# Altium footprint library 3M THD.PcbLib: 163 footprints (part 5 of 14) (continued)
## 3M_N2540-6003RB [mm] "40 Contacts - Straight .100\" x .100\" Low Profile Four-Wall Header"
height 9.91
pads (40):
  round 1.6 hole 1: 1(-24.13,-1.27) 2(-24.13,1.27) 3(-21.59,-1.27) 4(-21.59,1.27) 5(-19.05,-1.27) 6(-19.05,1.27) 7(-16.51,-1.27) 8(-16.51,1.27) 9(-13.97,-1.27) 10(-13.97,1.27) 11(-11.43,-1.27) 12(-11.43,1.27) 13(-8.89,-1.27) 14(-8.89,1.27) 15(-6.35,-1.27) 16(-6.35,1.27) 17(-3.81,-1.27) 18(-3.81,1.27) 19(-1.27,-1.27) 20(-1.27,1.27) 21(1.27,-1.27) 22(1.27,1.27) 23(3.81,-1.27) 24(3.81,1.27) 25(6.35,-1.27) 26(6.35,1.27) 27(8.89,-1.27) 28(8.89,1.27) 29(11.43,-1.27) 30(11.43,1.27) 31(13.97,-1.27) 32(13.97,1.27) 33(16.51,-1.27) 34(16.51,1.27) 35(19.05,-1.27) 36(19.05,1.27) 37(21.59,-1.27) 38(21.59,1.27) 39(24.13,-1.27) 40(24.13,1.27)
Top Overlay:
  circle w0.3: c-24.13,-4.699 r0.15
  lines w0.2: -28.042,-1.603 -25.629,-1.603 -25.629,1.603 -28.042,1.603 ; -28.042,-1.524 -28.346,-1.524 -28.346,1.524 -28.042,1.524 ; -24.994,-4.064 -24.13,-3.2 -23.266,-4.064 ; -23.178,3.15 -28.042,3.15 -28.042,-3.2 -3.366,-3.2 ; -23.178,4.064 -23.178,2.159 -22.469,2.159 ; -21.361,-3.835 -21.361,-3.2 ; -19.279,-3.835 -19.279,-3.2 ; -18.987,2.518 -18.987,4.064 ; -18.987,3.15 18.987,3.15 ; -3.366,-4.064 -3.366,-2.438 ; 0.826,-4.064 0.826,-2.438 ; 0.826,-3.2 28.042,-3.2 28.042,3.15 25.4,3.15 ; 18.987,2.518 18.987,4.064 ; 21.819,-3.835 21.819,-3.2 ; 22.469,2.159 23.178,2.159 23.178,4.064 ; 23.901,-3.835 23.901,-3.2 ; 28.042,-1.603 25.629,-1.603 25.629,1.603 28.042,1.603 ; 28.042,-1.524 28.346,-1.524 28.346,1.524 28.042,1.524 ; -29.058,-4.064 -22.352,-4.064 -22.352,-3.835 -18.288,-3.835 -18.288,-4.064 20.828,-4.064 20.828,-3.835 24.892,-3.835 24.892,-4.064 29.058,-4.064 29.058,4.064 28.397,4.064 ccw(c27.94,4.064) 27.483,4.064 -0.813,4.064 ccw(c-1.27,4.064) -1.727,4.064 -27.483,4.064 ccw(c-27.94,4.064) -28.397,4.064 -29.058,4.064 -29.058,-4.064
  text "40" at 23.495,2.667 h1.02
Mechanical 14:
  lines w0.1: -28.042,-1.603 -25.629,-1.603 -25.629,1.603 -28.042,1.603 ; -28.042,-1.524 -28.346,-1.524 -28.346,1.524 -28.042,1.524 ; -24.994,-4.064 -24.13,-3.2 -23.266,-4.064 ; -23.178,3.15 -28.042,3.15 -28.042,-3.2 -3.366,-3.2 ; -23.178,4.064 -23.178,2.159 -18.987,2.159 -18.987,4.064 ; -21.361,-3.835 -21.361,-3.2 ; -19.279,-3.835 -19.279,-3.2 ; -18.987,3.15 18.987,3.15 ; -3.366,-4.064 -3.366,-2.159 0.826,-2.159 0.826,-4.064 ; 0.826,-3.2 28.042,-3.2 28.042,3.15 25.4,3.15 ; 18.987,4.064 18.987,2.159 23.178,2.159 23.178,4.064 ; 21.819,-3.835 21.819,-3.2 ; 23.901,-3.835 23.901,-3.2 ; 28.042,-1.603 25.629,-1.603 25.629,1.603 28.042,1.603 ; 28.042,-1.524 28.346,-1.524 28.346,1.524 28.042,1.524 ; -29.058,-4.064 -22.352,-4.064 -22.352,-3.835 -18.288,-3.835 -18.288,-4.064 20.828,-4.064 20.828,-3.835 24.892,-3.835 24.892,-4.064 29.058,-4.064 29.058,4.064 28.397,4.064 ccw(c27.94,4.064) 27.483,4.064 -0.813,4.064 ccw(c-1.27,4.064) -1.727,4.064 -27.483,4.064 ccw(c-27.94,4.064) -28.397,4.064 -29.058,4.064 -29.058,-4.064
  text "40" at 23.495,2.667 h1.02
3D body "3M_N2540-6003RB.stp": height 9.91, standoff -3.94, extent -29.057,-4.115 29.058,4.521

## 3M_N2550-5002RB [mm] "50 Contacts - Right Angle .100\" x .100\" Low Profile Four-Wall Header"
height 8.59
pads (50):
  round 1.6 hole 0.9: 1(-30.48,-1.27) 2(-30.48,1.27) 3(-27.94,-1.27) 4(-27.94,1.27) 5(-25.4,-1.27) 6(-25.4,1.27) 7(-22.86,-1.27) 8(-22.86,1.27) 9(-20.32,-1.27) 10(-20.32,1.27) 11(-17.78,-1.27) 12(-17.78,1.27) 13(-15.24,-1.27) 14(-15.24,1.27) 15(-12.7,-1.27) 16(-12.7,1.27) 17(-10.16,-1.27) 18(-10.16,1.27) 19(-7.62,-1.27) 20(-7.62,1.27) 21(-5.08,-1.27) 22(-5.08,1.27) 23(-2.54,-1.27) 24(-2.54,1.27) 25(0,-1.27) 26(0,1.27) 27(2.54,-1.27) 28(2.54,1.27) 29(5.08,-1.27) 30(5.08,1.27) 31(7.62,-1.27) 32(7.62,1.27) 33(10.16,-1.27) 34(10.16,1.27) 35(12.7,-1.27) 36(12.7,1.27) 37(15.24,-1.27) 38(15.24,1.27) 39(17.78,-1.27) 40(17.78,1.27) 41(20.32,-1.27) 42(20.32,1.27) 43(22.86,-1.27) 44(22.86,1.27) 45(25.4,-1.27) 46(25.4,1.27) 47(27.94,-1.27) 48(27.94,1.27) 49(30.48,-1.27) 50(30.48,1.27)
Top Overlay:
  circle w0.3: c-32.25,-1.27 r0.15
  lines w0.2: -28.702,2.459 -28.702,11.273 ; -28.702,4.009 -27.432,4.009 -27.432,6.295 ; -27.711,11.273 -27.711,10.054 -25.629,10.054 -25.629,11.273 ; -27.432,4.85 -25.908,4.847 ; -27.432,6.297 cw(c-26.67,6.297) -25.908,6.297 ; -25.908,6.295 -25.908,4.009 -24.638,4.007 ; -24.638,2.459 -24.638,11.273 ; -3.366,11.273 cw(c-3.366,10.003) -2.096,10.003 -2.095,4.339 ccw(c-1.46,4.339) -1.46,3.704 1.46,3.704 ccw(c1.46,4.339) 2.095,4.339 2.095,10.003 cw(c3.366,10.003) 3.366,11.273 ; -2.095,4.847 2.095,4.847 ; -0.314,4.853 -0.314,10.719 ; 0.314,4.847 0.314,10.719 ; 27.178,2.459 27.178,11.273 ; 27.178,4.009 28.448,4.009 28.448,6.295 cw(c29.21,6.295) 29.972,6.295 29.972,4.009 31.242,4.009 ; 28.448,4.847 29.972,4.847 ; 31.242,2.459 31.242,11.273 ; -0.314,10.719 0.314,10.719 ; -0.314,10.719 -0.06,10.973 0.06,10.973 0.314,10.719 ; -35.408,1.875 -35.408,11.273 35.408,11.273 35.408,1.875 33.655,1.875 cw(c33.401,1.875) 33.147,1.875 33.147,2.459 -33.147,2.459 -33.147,1.875 cw(c-33.401,1.875) -33.655,1.875 -35.408,1.875
  text "50" at 31.965,0.206 h1.02
Mechanical 8:
  drawing of 204 lines, arcs and shapes, not listed
Mechanical 14:
  circle w0.3: c-32.25,-1.27 r0.15
  lines w0.1: -28.702,2.459 -28.702,11.273 ; -28.702,4.009 -27.432,4.009 -27.432,6.295 ; -27.711,11.273 -27.711,10.054 -25.629,10.054 -25.629,11.273 ; -27.432,4.85 -25.908,4.847 ; -27.432,6.297 cw(c-26.67,6.297) -25.908,6.297 ; -25.908,6.295 -25.908,4.009 -24.638,4.007 ; -24.638,2.459 -24.638,11.273 ; -3.366,11.273 cw(c-3.366,10.003) -2.096,10.003 -2.095,4.339 ccw(c-1.46,4.339) -1.46,3.704 1.46,3.704 ccw(c1.46,4.339) 2.095,4.339 2.095,10.003 cw(c3.366,10.003) 3.366,11.273 ; -2.095,4.847 2.095,4.847 ; -0.314,4.853 -0.314,10.719 ; 0.314,4.847 0.314,10.719 ; 27.178,2.459 27.178,11.273 ; 27.178,4.009 28.448,4.009 28.448,6.295 cw(c29.21,6.295) 29.972,6.295 29.972,4.009 31.242,4.009 ; 28.448,4.847 29.972,4.847 ; 31.242,2.459 31.242,11.273 ; -0.314,10.719 0.314,10.719 ; -0.314,10.719 -0.06,10.973 0.06,10.973 0.314,10.719 ; -35.408,1.875 -35.408,11.273 35.408,11.273 35.408,1.875 33.655,1.875 cw(c33.401,1.875) 33.147,1.875 33.147,2.459 -33.147,2.459 -33.147,1.875 cw(c-33.401,1.875) -33.655,1.875 -35.408,1.875
  text "50" at 31.965,0.206 h1.02
3D body "3M_N2550-5002RB.stp": height 8.69, standoff -3.98, extent -35.408,-1.575 35.408,11.273

## 3M_N2550-6002RB [mm] "50 Contacts - Straight .100\" x .100\" Low Profile Four-Wall Header"
height 9.91
pads (50):
  round 1.6 hole 1: 1(-30.48,-1.27) 2(-30.48,1.27) 3(-27.94,-1.27) 4(-27.94,1.27) 5(-25.4,-1.27) 6(-25.4,1.27) 7(-22.86,-1.27) 8(-22.86,1.27) 9(-20.32,-1.27) 10(-20.32,1.27) 11(-17.78,-1.27) 12(-17.78,1.27) 13(-15.24,-1.27) 14(-15.24,1.27) 15(-12.7,-1.27) 16(-12.7,1.27) 17(-10.16,-1.27) 18(-10.16,1.27) 19(-7.62,-1.27) 20(-7.62,1.27) 21(-5.08,-1.27) 22(-5.08,1.27) 23(-2.54,-1.27) 24(-2.54,1.27) 25(0,-1.27) 26(0,1.27) 27(2.54,-1.27) 28(2.54,1.27) 29(5.08,-1.27) 30(5.08,1.27) 31(7.62,-1.27) 32(7.62,1.27) 33(10.16,-1.27) 34(10.16,1.27) 35(12.7,-1.27) 36(12.7,1.27) 37(15.24,-1.27) 38(15.24,1.27) 39(17.78,-1.27) 40(17.78,1.27) 41(20.32,-1.27) 42(20.32,1.27) 43(22.86,-1.27) 44(22.86,1.27) 45(25.4,-1.27) 46(25.4,1.27) 47(27.94,-1.27) 48(27.94,1.27) 49(30.48,-1.27) 50(30.48,1.27)
Top Overlay:
  circle w0.3: c-30.48,-4.699 r0.15
  lines w0.2: -34.392,-1.603 -31.979,-1.603 -31.979,1.603 -34.392,1.603 ; -34.392,-1.524 -34.696,-1.524 -34.696,1.524 -34.392,1.524 ; -31.344,-4.064 -30.48,-3.2 -29.616,-4.064 ; -29.528,3.15 -34.392,3.15 -34.392,-3.2 -2.096,-3.2 ; -29.528,4.064 -29.528,2.159 -28.819,2.159 ; -27.711,-3.835 -27.711,-3.2 ; -25.629,-3.835 -25.629,-3.2 ; -25.337,2.518 -25.337,4.064 ; -25.337,3.15 25.337,3.15 ; -2.096,-4.064 -2.096,-2.438 ; 2.095,-4.064 2.095,-2.438 ; 2.095,-3.2 34.392,-3.2 34.392,3.15 31.75,3.15 ; 25.337,2.518 25.337,4.064 ; 28.169,-3.835 28.169,-3.2 ; 28.819,2.159 29.528,2.159 29.528,4.064 ; 30.251,-3.835 30.251,-3.2 ; 34.392,-1.603 31.979,-1.603 31.979,1.603 34.392,1.603 ; 34.392,-1.524 34.696,-1.524 34.696,1.524 34.392,1.524 ; -35.408,-4.064 -35.408,4.064 -34.747,4.064 cw(c-34.29,4.064) -33.833,4.064 -0.457,4.064 cw(c0,4.064) 0.457,4.064 33.833,4.064 cw(c34.29,4.064) 34.747,4.064 35.408,4.064 35.408,-4.064 31.242,-4.064 31.242,-3.835 27.178,-3.835 27.178,-4.064 -24.638,-4.064 -24.638,-3.835 -28.702,-3.835 -28.702,-4.064 -35.408,-4.064
  text "50" at 29.845,2.667 h1.02
Mechanical 14:
  lines w0.1: -34.392,-1.603 -31.979,-1.603 -31.979,1.603 -34.392,1.603 ; -34.392,-1.524 -34.696,-1.524 -34.696,1.524 -34.392,1.524 ; -31.344,-4.064 -30.48,-3.2 -29.616,-4.064 ; -29.528,3.15 -34.392,3.15 -34.392,-3.2 -2.096,-3.2 ; -29.528,4.064 -29.528,2.159 -25.337,2.159 -25.337,4.064 ; -27.711,-3.835 -27.711,-3.2 ; -25.629,-3.835 -25.629,-3.2 ; -25.337,3.15 25.337,3.15 ; -2.096,-4.064 -2.096,-2.159 2.095,-2.159 2.095,-4.064 ; 2.095,-3.2 34.392,-3.2 34.392,3.15 31.75,3.15 ; 25.337,4.064 25.337,2.159 29.528,2.159 29.528,4.064 ; 28.169,-3.835 28.169,-3.2 ; 30.251,-3.835 30.251,-3.2 ; 34.392,-1.603 31.979,-1.603 31.979,1.603 34.392,1.603 ; 34.392,-1.524 34.696,-1.524 34.696,1.524 34.392,1.524 ; -35.408,-4.064 -35.408,4.064 -34.747,4.064 cw(c-34.29,4.064) -33.833,4.064 -0.457,4.064 cw(c0,4.064) 0.457,4.064 33.833,4.064 cw(c34.29,4.064) 34.747,4.064 35.408,4.064 35.408,-4.064 31.242,-4.064 31.242,-3.835 27.178,-3.835 27.178,-4.064 -24.638,-4.064 -24.638,-3.835 -28.702,-3.835 -28.702,-4.064 -35.408,-4.064
  text "50" at 29.845,2.667 h1.02
3D body "3M_N2550-6002RB.stp": height 9.91, standoff -2.84, extent -35.408,-4.115 35.408,4.521

## 3M_N2550-6003RB [mm] "50 Contacts - Straight .100\" x .100\" Low Profile Four-Wall Header"
height 9.91
pads (50):
  round 1.6 hole 1: 1(-30.48,-1.27) 2(-30.48,1.27) 3(-27.94,-1.27) 4(-27.94,1.27) 5(-25.4,-1.27) 6(-25.4,1.27) 7(-22.86,-1.27) 8(-22.86,1.27) 9(-20.32,-1.27) 10(-20.32,1.27) 11(-17.78,-1.27) 12(-17.78,1.27) 13(-15.24,-1.27) 14(-15.24,1.27) 15(-12.7,-1.27) 16(-12.7,1.27) 17(-10.16,-1.27) 18(-10.16,1.27) 19(-7.62,-1.27) 20(-7.62,1.27) 21(-5.08,-1.27) 22(-5.08,1.27) 23(-2.54,-1.27) 24(-2.54,1.27) 25(0,-1.27) 26(0,1.27) 27(2.54,-1.27) 28(2.54,1.27) 29(5.08,-1.27) 30(5.08,1.27) 31(7.62,-1.27) 32(7.62,1.27) 33(10.16,-1.27) 34(10.16,1.27) 35(12.7,-1.27) 36(12.7,1.27) 37(15.24,-1.27) 38(15.24,1.27) 39(17.78,-1.27) 40(17.78,1.27) 41(20.32,-1.27) 42(20.32,1.27) 43(22.86,-1.27) 44(22.86,1.27) 45(25.4,-1.27) 46(25.4,1.27) 47(27.94,-1.27) 48(27.94,1.27) 49(30.48,-1.27) 50(30.48,1.27)
Top Overlay:
  circle w0.3: c-30.48,-4.699 r0.15
  lines w0.2: -34.392,-1.603 -31.979,-1.603 -31.979,1.603 -34.392,1.603 ; -34.392,-1.524 -34.696,-1.524 -34.696,1.524 -34.392,1.524 ; -31.344,-4.064 -30.48,-3.2 -29.616,-4.064 ; -29.528,3.15 -34.392,3.15 -34.392,-3.2 -2.096,-3.2 ; -29.528,4.064 -29.528,2.159 -28.819,2.159 ; -27.711,-3.835 -27.711,-3.2 ; -25.629,-3.835 -25.629,-3.2 ; -25.337,2.518 -25.337,4.064 ; -25.337,3.15 25.337,3.15 ; -2.096,-4.064 -2.096,-2.438 ; 2.095,-4.064 2.095,-2.438 ; 2.095,-3.2 34.392,-3.2 34.392,3.15 31.75,3.15 ; 25.337,2.518 25.337,4.064 ; 28.169,-3.835 28.169,-3.2 ; 28.819,2.159 29.528,2.159 29.528,4.064 ; 30.251,-3.835 30.251,-3.2 ; 34.392,-1.603 31.979,-1.603 31.979,1.603 34.392,1.603 ; 34.392,-1.524 34.696,-1.524 34.696,1.524 34.392,1.524 ; -35.408,-4.064 -28.702,-4.064 -28.702,-3.835 -24.638,-3.835 -24.638,-4.064 27.178,-4.064 27.178,-3.835 31.242,-3.835 31.242,-4.064 35.408,-4.064 35.408,4.064 34.747,4.064 ccw(c34.29,4.064) 33.833,4.064 0.457,4.064 ccw(c0,4.064) -0.457,4.064 -33.833,4.064 ccw(c-34.29,4.064) -34.747,4.064 -35.408,4.064 -35.408,-4.064
  text "50" at 29.845,2.667 h1.02
Mechanical 14:
  lines w0.1: -34.392,-1.603 -31.979,-1.603 -31.979,1.603 -34.392,1.603 ; -34.392,-1.524 -34.696,-1.524 -34.696,1.524 -34.392,1.524 ; -31.344,-4.064 -30.48,-3.2 -29.616,-4.064 ; -29.528,3.15 -34.392,3.15 -34.392,-3.2 -2.096,-3.2 ; -29.528,4.064 -29.528,2.159 -25.337,2.159 -25.337,4.064 ; -27.711,-3.835 -27.711,-3.2 ; -25.629,-3.835 -25.629,-3.2 ; -25.337,3.15 25.337,3.15 ; -2.096,-4.064 -2.096,-2.159 2.095,-2.159 2.095,-4.064 ; 2.095,-3.2 34.392,-3.2 34.392,3.15 31.75,3.15 ; 25.337,4.064 25.337,2.159 29.528,2.159 29.528,4.064 ; 28.169,-3.835 28.169,-3.2 ; 30.251,-3.835 30.251,-3.2 ; 34.392,-1.603 31.979,-1.603 31.979,1.603 34.392,1.603 ; 34.392,-1.524 34.696,-1.524 34.696,1.524 34.392,1.524 ; -35.408,-4.064 -28.702,-4.064 -28.702,-3.835 -24.638,-3.835 -24.638,-4.064 27.178,-4.064 27.178,-3.835 31.242,-3.835 31.242,-4.064 35.408,-4.064 35.408,4.064 34.747,4.064 ccw(c34.29,4.064) 33.833,4.064 0.457,4.064 ccw(c0,4.064) -0.457,4.064 -33.833,4.064 ccw(c-34.29,4.064) -34.747,4.064 -35.408,4.064 -35.408,-4.064
  text "50" at 29.845,2.667 h1.02
3D body "3M_N2550-6003RB.stp": height 9.91, standoff -3.94, extent -35.407,-4.115 35.408,4.521

## 3M_N2560-6002RB [mm] "60 Contacts - Straight .100\" x .100\" Low Profile Four-Wall Header"
height 9
pads (60):
  round 1.6 hole 1: 1(-36.83,-1.27) 2(-36.83,1.27) 3(-34.29,-1.27) 4(-34.29,1.27) 5(-31.75,-1.27) 6(-31.75,1.27) 7(-29.21,-1.27) 8(-29.21,1.27) 9(-26.67,-1.27) 10(-26.67,1.27) 11(-24.13,-1.27) 12(-24.13,1.27) 13(-21.59,-1.27) 14(-21.59,1.27) 15(-19.05,-1.27) 16(-19.05,1.27) 17(-16.51,-1.27) 18(-16.51,1.27) 19(-13.97,-1.27) 20(-13.97,1.27) 21(-11.43,-1.27) 22(-11.43,1.27) 23(-8.89,-1.27) 24(-8.89,1.27) 25(-6.35,-1.27) 26(-6.35,1.27) 27(-3.81,-1.27) 28(-3.81,1.27) 29(-1.27,-1.27) 30(-1.27,1.27) 31(1.27,-1.27) 32(1.27,1.27) 33(3.81,-1.27) 34(3.81,1.27) 35(6.35,-1.27) 36(6.35,1.27) 37(8.89,-1.27) 38(8.89,1.27) 39(11.43,-1.27) 40(11.43,1.27) 41(13.97,-1.27) 42(13.97,1.27) 43(16.51,-1.27) 44(16.51,1.27) 45(19.05,-1.27) 46(19.05,1.27) 47(21.59,-1.27) 48(21.59,1.27) 49(24.13,-1.27) 50(24.13,1.27) 51(26.67,-1.27) 52(26.67,1.27) 53(29.21,-1.27) 54(29.21,1.27) 55(31.75,-1.27) 56(31.75,1.27) 57(34.29,-1.27) 58(34.29,1.27) 59(36.83,-1.27) 60(36.83,1.27)
Top Overlay:
  circle w0.3: c-36.83,-4.699 r0.15
  lines w0.2: -40.742,-1.603 -38.329,-1.603 -38.329,1.603 -40.742,1.603 ; -40.742,-1.524 -41.046,-1.524 -41.046,1.524 -40.742,1.524 ; -37.694,-4.064 -36.83,-3.2 -35.966,-4.064 ; -35.878,3.15 -40.742,3.15 -40.742,-3.2 -3.366,-3.2 ; -35.878,4.064 -35.878,2.159 -35.169,2.159 ; -34.061,-3.835 -34.061,-3.2 ; -31.979,-3.835 -31.979,-3.2 ; -31.687,2.518 -31.687,4.064 ; -31.687,3.15 31.687,3.15 ; -3.366,-4.064 -3.366,-2.438 ; 0.826,-4.064 0.826,-2.438 ; 0.826,-3.2 40.742,-3.2 40.742,3.15 38.1,3.15 ; 31.687,2.518 31.687,4.064 ; 34.519,-3.835 34.519,-3.2 ; 35.169,2.159 35.878,2.159 35.878,4.064 ; 36.601,-3.835 36.601,-3.2 ; 40.742,-1.603 38.329,-1.603 38.329,1.603 40.742,1.603 ; 40.742,-1.524 41.046,-1.524 41.046,1.524 40.742,1.524 ; -41.758,-4.064 -35.052,-4.064 -35.052,-3.835 -30.988,-3.835 -30.988,-4.064 33.528,-4.064 33.528,-3.835 37.592,-3.835 37.592,-4.064 41.758,-4.064 41.758,4.064 41.097,4.064 ccw(c40.64,4.064) 40.183,4.064 -0.813,4.064 ccw(c-1.27,4.064) -1.727,4.064 -40.183,4.064 ccw(c-40.64,4.064) -41.097,4.064 -41.758,4.064 -41.758,-4.064
  text "60" at 36.195,2.667 h1.02
Mechanical 14:
  lines w0.1: -40.742,-1.603 -38.329,-1.603 -38.329,1.603 -40.742,1.603 ; -40.742,-1.524 -41.046,-1.524 -41.046,1.524 -40.742,1.524 ; -37.694,-4.064 -36.83,-3.2 -35.966,-4.064 ; -35.878,3.15 -40.742,3.15 -40.742,-3.2 -3.366,-3.2 ; -35.878,4.064 -35.878,2.159 -31.687,2.159 -31.687,4.064 ; -34.061,-3.835 -34.061,-3.2 ; -31.979,-3.835 -31.979,-3.2 ; -31.687,3.15 31.687,3.15 ; -3.366,-4.064 -3.366,-2.159 0.826,-2.159 0.826,-4.064 ; 0.826,-3.2 40.742,-3.2 40.742,3.15 38.1,3.15 ; 31.687,4.064 31.687,2.159 35.878,2.159 35.878,4.064 ; 34.519,-3.835 34.519,-3.2 ; 36.601,-3.835 36.601,-3.2 ; 40.742,-1.603 38.329,-1.603 38.329,1.603 40.742,1.603 ; 40.742,-1.524 41.046,-1.524 41.046,1.524 40.742,1.524 ; -41.758,-4.064 -35.052,-4.064 -35.052,-3.835 -30.988,-3.835 -30.988,-4.064 33.528,-4.064 33.528,-3.835 37.592,-3.835 37.592,-4.064 41.758,-4.064 41.758,4.064 41.097,4.064 ccw(c40.64,4.064) 40.183,4.064 -0.813,4.064 ccw(c-1.27,4.064) -1.727,4.064 -40.183,4.064 ccw(c-40.64,4.064) -41.097,4.064 -41.758,4.064 -41.758,-4.064
  text "60" at 36.195,2.667 h1.02
3D body "3M_N2560-6002RB.stp": height 9.65, standoff -2.84, extent -41.757,-4.166 41.758,4.521

## 3M_N2560-6003RB [mm] "60 Contacts - Straight .100\" x .100\" Low Profile Four-Wall Header"
height 9.91
pads (60):
  round 1.6 hole 1: 1(-36.83,-1.27) 2(-36.83,1.27) 3(-34.29,-1.27) 4(-34.29,1.27) 5(-31.75,-1.27) 6(-31.75,1.27) 7(-29.21,-1.27) 8(-29.21,1.27) 9(-26.67,-1.27) 10(-26.67,1.27) 11(-24.13,-1.27) 12(-24.13,1.27) 13(-21.59,-1.27) 14(-21.59,1.27) 15(-19.05,-1.27) 16(-19.05,1.27) 17(-16.51,-1.27) 18(-16.51,1.27) 19(-13.97,-1.27) 20(-13.97,1.27) 21(-11.43,-1.27) 22(-11.43,1.27) 23(-8.89,-1.27) 24(-8.89,1.27) 25(-6.35,-1.27) 26(-6.35,1.27) 27(-3.81,-1.27) 28(-3.81,1.27) 29(-1.27,-1.27) 30(-1.27,1.27) 31(1.27,-1.27) 32(1.27,1.27) 33(3.81,-1.27) 34(3.81,1.27) 35(6.35,-1.27) 36(6.35,1.27) 37(8.89,-1.27) 38(8.89,1.27) 39(11.43,-1.27) 40(11.43,1.27) 41(13.97,-1.27) 42(13.97,1.27) 43(16.51,-1.27) 44(16.51,1.27) 45(19.05,-1.27) 46(19.05,1.27) 47(21.59,-1.27) 48(21.59,1.27) 49(24.13,-1.27) 50(24.13,1.27) 51(26.67,-1.27) 52(26.67,1.27) 53(29.21,-1.27) 54(29.21,1.27) 55(31.75,-1.27) 56(31.75,1.27) 57(34.29,-1.27) 58(34.29,1.27) 59(36.83,-1.27) 60(36.83,1.27)
Top Overlay:
  circle w0.3: c-36.83,-4.699 r0.15
  lines w0.2: -40.742,-1.603 -38.329,-1.603 -38.329,1.603 -40.742,1.603 ; -40.742,-1.524 -41.046,-1.524 -41.046,1.524 -40.742,1.524 ; -37.694,-4.064 -36.83,-3.2 -35.966,-4.064 ; -35.878,3.15 -40.742,3.15 -40.742,-3.2 -3.366,-3.2 ; -35.878,4.064 -35.878,2.159 -35.169,2.159 ; -34.061,-3.835 -34.061,-3.2 ; -31.979,-3.835 -31.979,-3.2 ; -31.687,2.518 -31.687,4.064 ; -31.687,3.15 31.687,3.15 ; -3.366,-4.064 -3.366,-2.438 ; 0.826,-4.064 0.826,-2.438 ; 0.826,-3.2 40.742,-3.2 40.742,3.15 38.1,3.15 ; 31.687,2.518 31.687,4.064 ; 34.519,-3.835 34.519,-3.2 ; 35.169,2.159 35.878,2.159 35.878,4.064 ; 36.601,-3.835 36.601,-3.2 ; 40.742,-1.603 38.329,-1.603 38.329,1.603 40.742,1.603 ; 40.742,-1.524 41.046,-1.524 41.046,1.524 40.742,1.524 ; -41.758,-4.064 -41.758,4.064 -41.097,4.064 cw(c-40.64,4.064) -40.183,4.064 -1.727,4.064 cw(c-1.27,4.064) -0.813,4.064 40.183,4.064 cw(c40.64,4.064) 41.097,4.064 41.758,4.064 41.758,-4.064 37.592,-4.064 37.592,-3.835 33.528,-3.835 33.528,-4.064 -30.988,-4.064 -30.988,-3.835 -35.052,-3.835 -35.052,-4.064 -41.758,-4.064
  text "60" at 36.195,2.667 h1.02
Mechanical 14:
  lines w0.1: -40.742,-1.603 -38.329,-1.603 -38.329,1.603 -40.742,1.603 ; -40.742,-1.524 -41.046,-1.524 -41.046,1.524 -40.742,1.524 ; -37.694,-4.064 -36.83,-3.2 -35.966,-4.064 ; -35.878,3.15 -40.742,3.15 -40.742,-3.2 -3.366,-3.2 ; -35.878,4.064 -35.878,2.159 -31.687,2.159 -31.687,4.064 ; -34.061,-3.835 -34.061,-3.2 ; -31.979,-3.835 -31.979,-3.2 ; -31.687,3.15 31.687,3.15 ; -3.366,-4.064 -3.366,-2.159 0.826,-2.159 0.826,-4.064 ; 0.826,-3.2 40.742,-3.2 40.742,3.15 38.1,3.15 ; 31.687,4.064 31.687,2.159 35.878,2.159 35.878,4.064 ; 34.519,-3.835 34.519,-3.2 ; 36.601,-3.835 36.601,-3.2 ; 40.742,-1.603 38.329,-1.603 38.329,1.603 40.742,1.603 ; 40.742,-1.524 41.046,-1.524 41.046,1.524 40.742,1.524 ; -41.758,-4.064 -41.758,4.064 -41.097,4.064 cw(c-40.64,4.064) -40.183,4.064 -1.727,4.064 cw(c-1.27,4.064) -0.813,4.064 40.183,4.064 cw(c40.64,4.064) 41.097,4.064 41.758,4.064 41.758,-4.064 37.592,-4.064 37.592,-3.835 33.528,-3.835 33.528,-4.064 -30.988,-4.064 -30.988,-3.835 -35.052,-3.835 -35.052,-4.064 -41.758,-4.064
  text "60" at 36.195,2.667 h1.02
3D body "3M_N2560-6003RB.stp": height 9.65, standoff -3.94, extent -41.757,-4.166 41.758,4.521

## 3M_N2564-5002RB [mm] "64 Contacts - Right Angle .100\" x .100\" Low Profile Four-Wall Header"
height 8.59
pads (64):
  round 1.6 hole 0.9: 1(-39.37,-1.27) 2(-39.37,1.27) 3(-36.83,-1.27) 4(-36.83,1.27) 5(-34.29,-1.27) 6(-34.29,1.27) 7(-31.75,-1.27) 8(-31.75,1.27) 9(-29.21,-1.27) 10(-29.21,1.27) 11(-26.67,-1.27) 12(-26.67,1.27) 13(-24.13,-1.27) 14(-24.13,1.27) 15(-21.59,-1.27) 16(-21.59,1.27) 17(-19.05,-1.27) 18(-19.05,1.27) 19(-16.51,-1.27) 20(-16.51,1.27) 21(-13.97,-1.27) 22(-13.97,1.27) 23(-11.43,-1.27) 24(-11.43,1.27) 25(-8.89,-1.27) 26(-8.89,1.27) 27(-6.35,-1.27) 28(-6.35,1.27) 29(-3.81,-1.27) 30(-3.81,1.27) 31(-1.27,-1.27) 32(-1.27,1.27) 33(1.27,-1.27) 34(1.27,1.27) 35(3.81,-1.27) 36(3.81,1.27) 37(6.35,-1.27) 38(6.35,1.27) 39(8.89,-1.27) 40(8.89,1.27) 41(11.43,-1.27) 42(11.43,1.27) 43(13.97,-1.27) 44(13.97,1.27) 45(16.51,-1.27) 46(16.51,1.27) 47(19.05,-1.27) 48(19.05,1.27) 49(21.59,-1.27) 50(21.59,1.27) 51(24.13,-1.27) 52(24.13,1.27) 53(26.67,-1.27) 54(26.67,1.27) 55(29.21,-1.27) 56(29.21,1.27) 57(31.75,-1.27) 58(31.75,1.27) 59(34.29,-1.27) 60(34.29,1.27) 61(36.83,-1.27) 62(36.83,1.27) 63(39.37,-1.27) 64(39.37,1.27)
Top Overlay:
  circle w0.3: c-41.14,-1.27 r0.15
  lines w0.2: -42.545,1.879 ccw(c-42.291,1.882) -42.037,1.882 -42.037,2.466 42.037,2.466 42.037,1.882 ccw(c42.291,1.882) 42.545,1.882 44.298,1.882 44.298,11.28 39.141,11.28 39.141,10.06 37.059,10.06 37.059,11.28 -34.519,11.28 -34.519,10.06 -36.601,10.06 -36.601,11.28 -44.298,11.28 -44.298,1.882 -42.545,1.882 ; -40.386,11.28 -39.37,8.74 -38.354,11.28 ; -37.592,2.466 -37.592,11.28 ; -37.592,4.015 -36.322,4.015 -36.322,6.301 cw(c-35.56,6.301) -34.798,6.301 -34.798,4.015 -33.528,4.015 ; -36.601,10.719 -36.516,10.719 ; -36.601,10.805 -36.516,10.719 ; -36.516,10.06 -36.516,10.719 ; -36.322,4.853 -34.798,4.853 ; -34.604,10.06 -34.604,10.719 ; -34.519,10.719 -34.604,10.719 ; -34.519,10.805 -34.604,10.719 ; -33.528,2.466 -33.528,11.28 ; -3.366,11.28 cw(c-3.366,10.01) -2.096,10.01 -2.095,4.345 ccw(c-1.46,4.345) -1.461,3.71 1.46,3.71 ccw(c1.46,4.345) 2.095,4.345 2.095,10.01 cw(c3.366,10.01) 3.366,11.28 ; -2.095,4.853 2.095,4.853 ; -1.584,4.853 -1.584,10.719 ; -0.956,4.853 -0.956,10.719 ; 0.956,4.853 0.956,10.719 ; 1.584,4.853 1.584,10.719 ; 36.068,2.466 36.068,11.28 ; 36.068,4.015 37.338,4.015 37.338,6.301 cw(c38.1,6.301) 38.862,6.301 38.862,4.015 40.132,4.015 ; 37.059,10.719 37.144,10.719 ; 37.059,10.805 37.144,10.719 ; 37.144,10.06 37.144,10.719 ; 37.338,4.854 38.862,4.853 ; 38.418,4.853 38.418,6.994 ; 38.419,10.06 cw(c39.688,10.01) 39.141,11.156 ; 39.056,10.06 39.056,10.719 ; 39.141,10.719 39.056,10.719 ; 39.141,10.805 39.056,10.719 ; 40.132,2.466 40.132,11.28 ; -1.584,10.719 -1.33,10.973 -1.21,10.973 -0.956,10.719 ; -1.584,10.719 -0.956,10.719 ; 0.956,10.719 1.21,10.973 1.33,10.973 1.584,10.719 ; 0.956,10.719 1.584,10.719
  text "64" at 40.855,0.206 h1.02
Mechanical 8:
  drawing of 260 lines, arcs and shapes, not listed
Mechanical 14:
  drawing of 301 lines, arcs and shapes, not listed
3D body "3M_N2564-5002RB.stp": height 8.69, standoff -3.98, extent -44.298,-1.575 44.298,11.28

## 3M_N2564-6002RB [mm] "64 Contacts - Straight .100\" x .100\" Low Profile Four-Wall Header"
height 9.91
pads (64):
  round 1.6 hole 1: 1(-39.37,-1.27) 2(-39.37,1.27) 3(-36.83,-1.27) 4(-36.83,1.27) 5(-34.29,-1.27) 6(-34.29,1.27) 7(-31.75,-1.27) 8(-31.75,1.27) 9(-29.21,-1.27) 10(-29.21,1.27) 11(-26.67,-1.27) 12(-26.67,1.27) 13(-24.13,-1.27) 14(-24.13,1.27) 15(-21.59,-1.27) 16(-21.59,1.27) 17(-19.05,-1.27) 18(-19.05,1.27) 19(-16.51,-1.27) 20(-16.51,1.27) 21(-13.97,-1.27) 22(-13.97,1.27) 23(-11.43,-1.27) 24(-11.43,1.27) 25(-8.89,-1.27) 26(-8.89,1.27) 27(-6.35,-1.27) 28(-6.35,1.27) 29(-3.81,-1.27) 30(-3.81,1.27) 31(-1.27,-1.27) 32(-1.27,1.27) 33(1.27,-1.27) 34(1.27,1.27) 35(3.81,-1.27) 36(3.81,1.27) 37(6.35,-1.27) 38(6.35,1.27) 39(8.89,-1.27) 40(8.89,1.27) 41(11.43,-1.27) 42(11.43,1.27) 43(13.97,-1.27) 44(13.97,1.27) 45(16.51,-1.27) 46(16.51,1.27) 47(19.05,-1.27) 48(19.05,1.27) 49(21.59,-1.27) 50(21.59,1.27) 51(24.13,-1.27) 52(24.13,1.27) 53(26.67,-1.27) 54(26.67,1.27) 55(29.21,-1.27) 56(29.21,1.27) 57(31.75,-1.27) 58(31.75,1.27) 59(34.29,-1.27) 60(34.29,1.27) 61(36.83,-1.27) 62(36.83,1.27) 63(39.37,-1.27) 64(39.37,1.27)
Top Overlay:
  circle w0.3: c-39.37,-4.699 r0.15
  lines w0.2: -43.282,-1.603 -40.869,-1.603 -40.869,1.603 -43.282,1.603 ; -43.282,-1.524 -43.586,-1.524 -43.586,1.524 -43.282,1.524 ; -40.234,-4.064 -39.37,-3.2 -38.506,-4.064 ; -38.418,3.15 -43.282,3.15 -43.282,-3.2 -3.366,-3.2 ; -38.418,4.064 -38.418,2.159 -37.709,2.159 ; -36.601,-3.835 -36.601,-3.2 ; -34.519,-3.835 -34.519,-3.2 ; -34.227,2.518 -34.227,4.064 ; -34.227,3.15 34.227,3.15 ; -3.366,-4.064 -3.366,-2.438 ; 0.826,-4.064 0.826,-2.438 ; 0.826,-3.2 43.282,-3.2 43.282,3.15 40.64,3.15 ; 34.227,2.518 34.227,4.064 ; 37.059,-3.835 37.059,-3.2 ; 37.709,2.159 38.418,2.159 38.418,4.064 ; 39.141,-3.835 39.141,-3.2 ; 43.282,-1.603 40.869,-1.603 40.869,1.603 43.282,1.603 ; 43.282,-1.524 43.586,-1.524 43.586,1.524 43.282,1.524 ; -44.298,-4.064 -44.298,4.064 -43.637,4.064 cw(c-43.18,4.064) -42.723,4.064 -1.727,4.064 cw(c-1.27,4.064) -0.813,4.064 42.723,4.064 cw(c43.18,4.064) 43.637,4.064 44.298,4.064 44.298,-4.064 40.132,-4.064 40.132,-3.835 36.068,-3.835 36.068,-4.064 -33.528,-4.064 -33.528,-3.835 -37.592,-3.835 -37.592,-4.064 -44.298,-4.064
  text "64" at 38.735,2.667 h1.02
Mechanical 14:
  lines w0.1: -43.282,-1.603 -40.869,-1.603 -40.869,1.603 -43.282,1.603 ; -43.282,-1.524 -43.586,-1.524 -43.586,1.524 -43.282,1.524 ; -40.234,-4.064 -39.37,-3.2 -38.506,-4.064 ; -38.418,3.15 -43.282,3.15 -43.282,-3.2 -3.366,-3.2 ; -38.418,4.064 -38.418,2.159 -34.227,2.159 -34.227,4.064 ; -36.601,-3.835 -36.601,-3.2 ; -34.519,-3.835 -34.519,-3.2 ; -34.227,3.15 34.227,3.15 ; -3.366,-4.064 -3.366,-2.159 0.826,-2.159 0.826,-4.064 ; 0.826,-3.2 43.282,-3.2 43.282,3.15 40.64,3.15 ; 34.227,4.064 34.227,2.159 38.418,2.159 38.418,4.064 ; 37.059,-3.835 37.059,-3.2 ; 39.141,-3.835 39.141,-3.2 ; 43.282,-1.603 40.869,-1.603 40.869,1.603 43.282,1.603 ; 43.282,-1.524 43.586,-1.524 43.586,1.524 43.282,1.524 ; -44.298,-4.064 -44.298,4.064 -43.637,4.064 cw(c-43.18,4.064) -42.723,4.064 -1.727,4.064 cw(c-1.27,4.064) -0.813,4.064 42.723,4.064 cw(c43.18,4.064) 43.637,4.064 44.298,4.064 44.298,-4.064 40.132,-4.064 40.132,-3.835 36.068,-3.835 36.068,-4.064 -33.528,-4.064 -33.528,-3.835 -37.592,-3.835 -37.592,-4.064 -44.298,-4.064
  text "64" at 38.735,2.667 h1.02
3D body "3M_N2564-6002RB.stp": height 9.91, standoff -2.84, extent -44.297,-4.115 44.298,4.521